# Altium footprint library UZ_CarrierBoard.PcbLib: 91 footprints (part 1 of 6)
Each footprint in its own frame and in the unit in brackets; x right, y up, seen from the top. Pads: shape width x height; smd on the part's side, far side on the other; paste and mask are expansions set on the pad; w line width, h text height; cw(c..) or ccw(c..) is an arc to the next point about the centre after c.
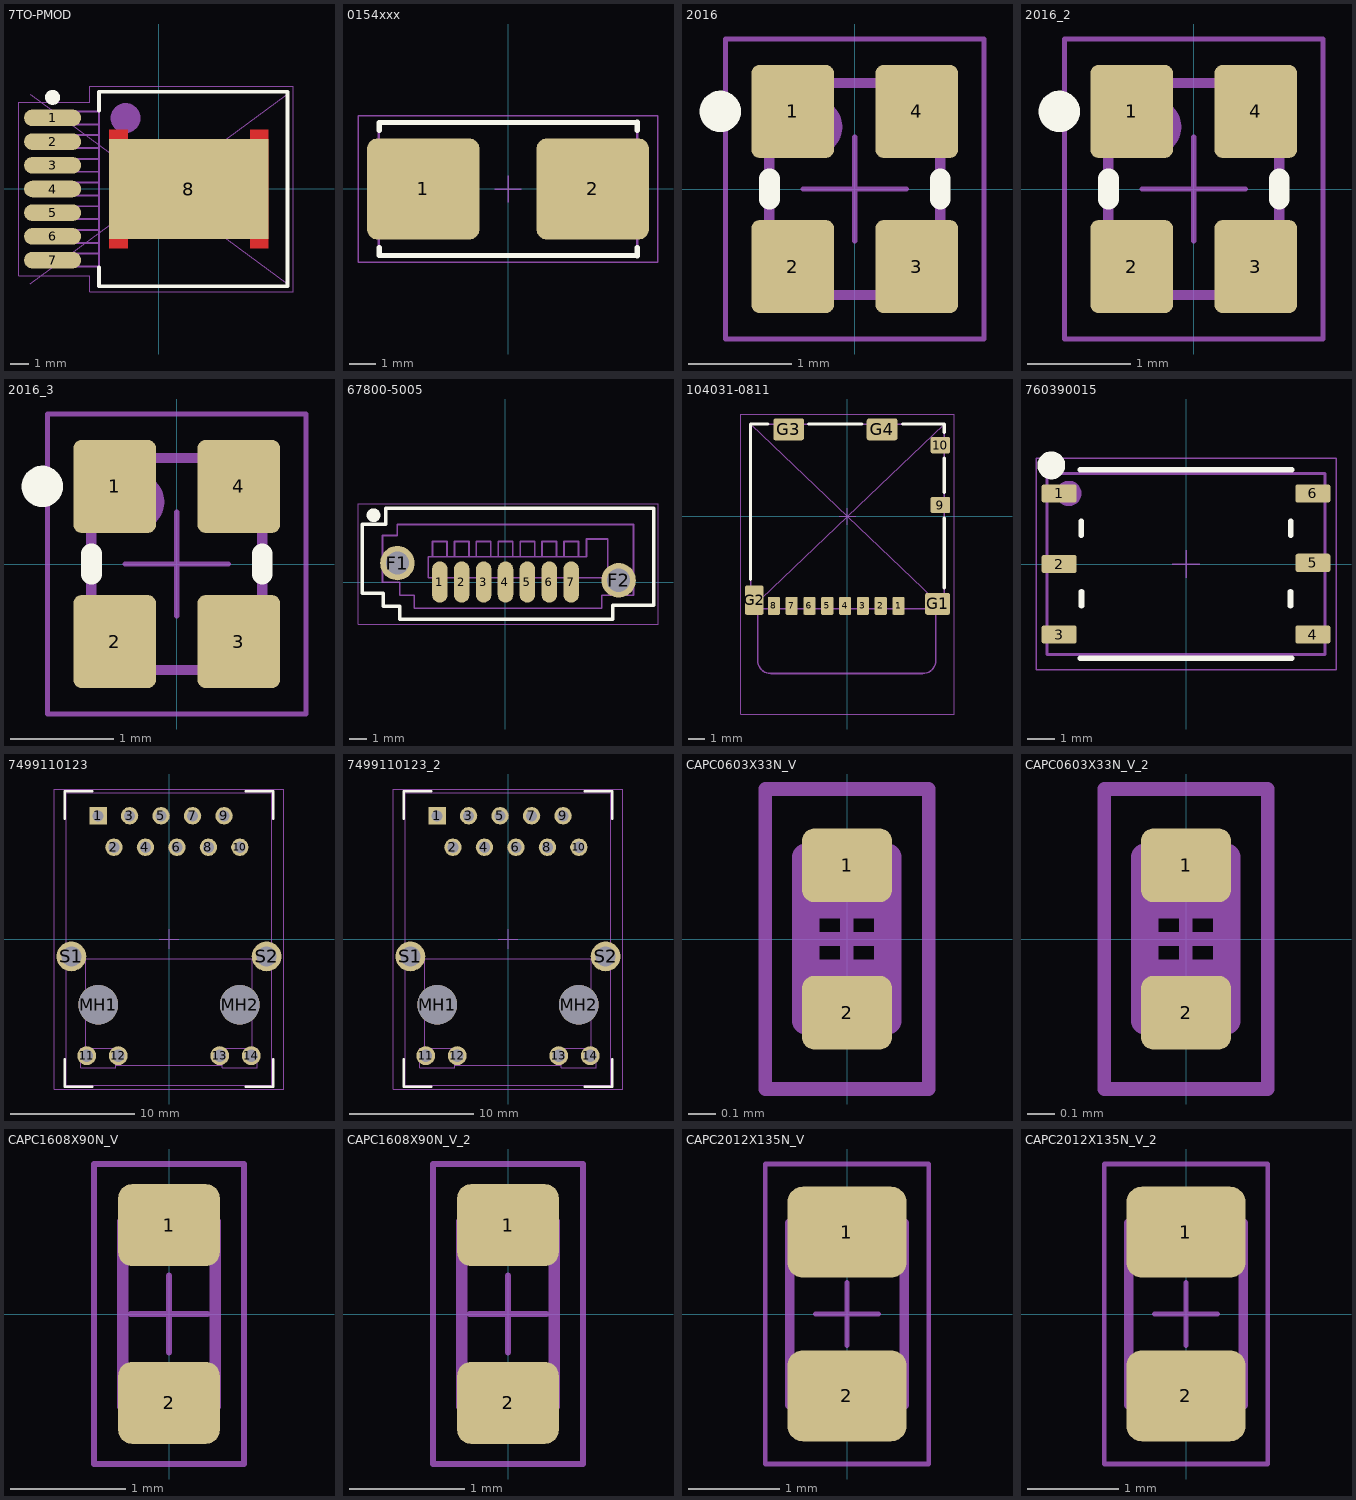
[diagram p0: the footprints below, top view; thin cyan lines are the x and y axes]

## 7TO-PMOD [mm]
pads (8):
  oval 3.06x0.89 smd: 1(-5.7,3.81) 2(-5.7,2.54) 3(-5.7,1.27) 4(-5.7,0) 5(-5.7,-1.27) 6(-5.7,-2.54) 7(-5.7,-3.81)
  rect 8.54x5.35 smd: 8(1.605,0)
Top Layer:
  region: -2.665,3.2 -2.665,-3.2 -1.665,-3.2 -1.665,3.2
  region: 5.875,-3.2 5.875,3.2 4.875,3.2 4.875,-3.2
Top Overlay:
  circle w0.4: c-5.7,4.91 r0.2
  lines w0.2: -3.215,-4.205 -3.215,-5.205 6.885,-5.205 6.885,5.205 -3.215,5.205 -3.215,4.205
Mechanical 13:
  circle w0.8: c-1.79,3.8 r0.4
  lines w0.1: -6.89,-4.155 -3.215,-4.155 ; -6.89,-3.465 -3.215,-3.465 ; -6.89,-2.885 -3.215,-2.885 ; -6.89,-2.195 -3.215,-2.195 ; -6.89,-1.615 -3.215,-1.615 ; -6.89,-0.925 -3.215,-0.925 ; -6.89,-0.345 -3.215,-0.345 ; -6.89,0.345 -3.215,0.345 ; -6.89,0.925 -3.215,0.925 ; -6.89,1.615 -3.215,1.615 ; -6.89,2.195 -3.215,2.195 ; -6.89,2.885 -3.215,2.885 ; -6.89,3.465 -3.215,3.465 ; -6.89,4.155 -3.215,4.155 ; -6.885,-4.155 -6.885,-3.465 ; -6.885,-2.885 -6.885,-2.195 ; -6.885,-1.615 -6.885,-0.925 ; -6.885,-0.345 -6.885,0.345 ; -6.885,0.925 -6.885,1.615 ; -6.885,2.195 -6.885,2.885 ; -6.885,3.465 -6.885,4.155 ; -4.79,-4.155 -4.79,-3.465 ; -4.79,-2.885 -4.79,-2.195 ; -4.79,-1.615 -4.79,-0.925 ; -4.79,-0.345 -4.79,0.345 ; -4.79,0.93 -4.79,1.615 ; -4.79,2.205 -4.79,2.885 ; -4.79,3.465 -4.79,4.155 ; -3.215,-5.205 6.885,-5.205 6.885,5.205 -3.215,5.205 -3.215,-5.205
  text ".Designator" at 1.512,1.045 h1
Mechanical 15:
  lines w0.05: -6.885,-5.08 6.885,5.08 ; -6.885,5.08 6.885,-5.08 ; -0.5,0 0.5,0 ; 0,-0.5 0,0.5 ; -7.5,-4.65 -3.7,-4.65 -3.7,-5.5 7.2,-5.5 7.2,5.5 -3.7,5.5 -3.7,4.65 -7.5,4.65 -7.5,-4.65
3D body: height 5.22, standoff 0, extent -1.739,2.675 -0.541,3.87
3D body "NDW0007A.stp": height 4.77, standoff 0, extent -6.885,-5.08 6.885,5.08

## 0154xxx [mm]
pads (2):
  rrect20% 4.24x3.81 smd: 1(-3.19,0) 2(3.19,0)
Top Overlay:
  lines w0.2: -4.85,-2.2 -4.85,-2.5 -4.835,-2.5 4.865,-2.515 4.865,-2.215 ; -4.85,2.2 -4.85,2.5 -4.835,2.5 4.865,2.515 4.865,2.215
Mechanical 13:
  lines w0.1: -4.865,-2.515 -4.865,2.515 4.865,2.515 4.865,-2.515 -4.865,-2.515
  text ".Designator" at -0.781,-0.456 h1
Mechanical 15:
  lines w0.05: -0.5,0 0.5,0 ; 0,-0.5 0,0.5 ; -5.65,-2.75 -5.65,2.75 5.65,2.75 5.65,-2.75 -5.65,-2.75
3D body "User Library-Littlefuse 0154 Holder and Fuse.STEP": height 3.71, standoff 0.01, extent -4.835,-2.485 4.865,2.515

## 2016 [mm]
pads (4):
  rrect20% 0.8x0.9 smd: 1(-0.6,0.75) 2(-0.6,-0.75) 3(0.6,-0.75) 4(0.6,0.75)
Top Overlay:
  circle w0.2: c-1.3,0.75 r0.1
  lines w0.2: -0.825,-0.1 -0.825,0.1 ; 0.825,-0.1 0.825,0.1
Mechanical 13:
  circle w0.28: c-0.4,0.6 r0.14
  lines w0.1: -0.825,-1.025 0.825,-1.025 0.825,1.025 ; -0.825,-1.025 -0.825,-1.025 ; -0.825,-1.025 -0.825,1.025 0.825,1.025 ; 0.825,1.025 0.825,1.025
  text ".Designator" at 1.834,2.284 h1
Mechanical 15:
  lines w0.05: -0.5,0 0.5,0 ; 0,-0.5 0,0.5 ; -1.25,-1.45 -1.25,1.45 1.25,1.45 1.25,-1.45 -1.25,-1.45
3D body: height 0.8, standoff 0, extent -0.825,-1.025 0.825,1.025
3D body: height 0.81, standoff 0, extent -0.599,0.4 -0.2,0.798

## 2016_2 [mm]
pads (4):
  rrect20% 0.8x0.9 smd: 1(-0.6,0.75) 2(-0.6,-0.75) 3(0.6,-0.75) 4(0.6,0.75)
Top Overlay:
  circle w0.2: c-1.3,0.75 r0.1
  lines w0.2: -0.825,-0.1 -0.825,0.1 ; 0.825,-0.1 0.825,0.1
Mechanical 13:
  circle w0.28: c-0.4,0.6 r0.14
  lines w0.1: -0.825,-1.025 0.825,-1.025 0.825,1.025 ; -0.825,-1.025 -0.825,-1.025 ; -0.825,-1.025 -0.825,1.025 0.825,1.025 ; 0.825,1.025 0.825,1.025
  text ".Designator" at 0.618,0.186 h1
Mechanical 15:
  lines w0.05: -0.5,0 0.5,0 ; 0,-0.5 0,0.5 ; -1.25,-1.45 -1.25,1.45 1.25,1.45 1.25,-1.45 -1.25,-1.45
3D body: height 0.8, standoff 0, extent -0.825,-1.025 0.825,1.025
3D body: height 0.81, standoff 0, extent -0.599,0.4 -0.2,0.798

## 2016_3 [mm]
pads (4):
  rrect20% 0.8x0.9 smd: 1(-0.6,0.75) 2(-0.6,-0.75) 3(0.6,-0.75) 4(0.6,0.75)
Top Overlay:
  circle w0.2: c-1.3,0.75 r0.1
  lines w0.2: -0.825,-0.1 -0.825,0.1 ; 0.825,-0.1 0.825,0.1
Mechanical 13:
  circle w0.28: c-0.4,0.6 r0.14
  lines w0.1: -0.825,-1.025 0.825,-1.025 0.825,1.025 ; -0.825,-1.025 -0.825,-1.025 ; -0.825,-1.025 -0.825,1.025 0.825,1.025 ; 0.825,1.025 0.825,1.025
  text ".Designator" at 2.101,-0.6 h1
Mechanical 15:
  lines w0.05: -0.5,0 0.5,0 ; 0,-0.5 0,0.5 ; -1.25,-1.45 -1.25,1.45 1.25,1.45 1.25,-1.45 -1.25,-1.45
3D body: height 0.8, standoff 0, extent -0.825,-1.025 0.825,1.025
3D body: height 0.81, standoff 0, extent -0.599,0.4 -0.2,0.798

## 67800-5005 [mm]
pads (9):
  oval 0.9x2.4 smd: 1(-3.81,0) 2(-2.54,0) 3(-1.27,0) 4(0,0) 5(1.27,0) 6(2.54,0) 7(3.81,0)
  round 2 hole 1.35: F1(-6.27,1.1) F2(6.56,0.1)
Top Overlay:
  circle w0.4: c-7.655,3.875 r0.2
  lines w0.2: -7.095,-1.41 -6.135,-1.41 -6.135,-2.16 6.215,-2.16 6.215,-1.36 8.595,-1.36 8.595,4.29 -6.935,4.29 -6.935,3.34 -8.305,3.34 -8.305,-0.66 -7.09,-0.66 -7.09,-1.41
Mechanical 13:
  circle w0.1: c-6.27,1.1 r0.5
  circle w0.1: c6.56,0.1 r0.5
  lines w0.1: -7.135,-0.02 -7.135,2.7 ; -7.13,-0.02 -6.13,-0.02 -6.13,-0.77 ; -7.13,2.7 -6.275,2.7 -6.275,3.34 7.425,3.34 7.425,-0.77 5.575,-0.77 5.575,-1.52 -5.285,-1.52 -5.285,-0.77 -6.135,-0.77 ; -7.095,-1.41 -6.135,-1.41 -6.135,-2.16 6.215,-2.16 6.215,-1.36 8.595,-1.36 8.595,4.29 -6.935,4.29 -6.935,3.34 -8.305,3.34 -8.305,-0.66 -7.09,-0.66 -7.09,-1.41 ; -4.23,1.47 -4.23,2.35 -3.39,2.35 -3.39,1.47 ; -2.96,1.47 -2.96,2.35 -2.12,2.35 -2.12,1.47 ; -1.69,1.47 -1.69,2.35 -0.85,2.35 -0.85,1.47 ; -0.42,1.47 -0.42,2.35 0.42,2.35 0.42,1.47 ; 0.85,1.47 0.85,2.35 1.69,2.35 1.69,1.47 ; 2.12,1.47 2.12,2.35 2.96,2.35 2.96,1.47 ; 3.39,1.47 3.39,2.35 4.23,2.35 4.23,1.47 ; -4.485,0.24 5.925,0.24 5.925,2.49 4.695,2.49 4.695,1.47 -4.485,1.47 -4.485,0.24
  text ".Designator" at -0.5,-1.1 h1
  text "1" at -3.885,2.51 h0.6
  text "2" at -2.73,2.51 h0.6
  text "3" at -1.47,2.51 h0.6
  text "4" at -0.21,2.51 h0.6
  text "5" at 1.05,2.51 h0.6
  text "6" at 2.31,2.51 h0.6
  text "7" at 3.675,2.51 h0.6
Mechanical 15:
  lines w0.05: -0.5,0 0.5,0 ; 0,-0.5 0,0.5 ; -8.555,-2.45 8.845,-2.45 8.845,4.54 -8.555,4.54 -8.555,-2.45
3D body "678005005.stp": height 8.6, standoff -2.45, extent -8.305,-2.16 8.595,4.29

## 104031-0811 [mm]
pads (14):
  rrect20% 0.75x1.1 smd: 1(3.155,-5.525) 2(2.055,-5.525) 3(0.955,-5.525) 4(-0.145,-5.525) 5(-1.245,-5.525) 6(-2.345,-5.525) 7(-3.445,-5.525) 8(-4.545,-5.525)
  rrect20% 1.2x1 smd: 9(5.74,0.7) 10(5.74,4.4)
  rrect20% 1.55x1.35 smd: G1(5.565,-5.4)
  rrect20% 1.17x1.8 smd: G2(-5.755,-5.175)
  rrect20% 1.9x1.35 smd: G3(-3.63,5.375) G4(2.14,5.375)
Top Overlay:
  lines w0.2: -5.98,-3.9 -5.98,5.7 -4.9,5.7 ; -2.4,5.7 0.9,5.7 ; 3.4,5.705 5.975,5.705 5.975,5.2 ; 5.975,-4.4 5.975,-0.1 ; 5.975,1.5 5.975,3.6
Mechanical 13:
  lines w0.1: -5.545,-5.7 -5.545,-8.9 ccw(c-4.745,-8.9) -4.745,-9.7 4.655,-9.7 ; 0,-5.7 5.565,-5.7 ; 5.455,-5.7 5.455,-8.9 ; 4.655,-9.7 ccw(c4.655,-8.9) 5.455,-8.9 ; 4.655,-9.7 ccw(c4.655,-8.9) 5.455,-8.9 ; -5.975,-5.7 -5.975,5.7 5.975,5.7 5.975,-5.7 -5.975,-5.7
  text ".Designator" at 0.554,-1.554 h1.3
Mechanical 15:
  lines w0.05: -5.975,-5.7 5.975,5.7 ; -5.975,5.7 5.975,-5.7 ; -0.5,0 0.5,0 ; -0.1,-5.7 0.1,-5.7 ; 0,-5.8 0,-5.6 ; 0,-0.5 0,0.5 ; -6.6,-12.2 -6.6,6.3 6.6,6.3 6.6,-12.2 -6.6,-12.2
3D body "1040310811.stp": height 1.43, standoff -0.02, extent -5.975,-5.7 5.975,5.7
3D body "SW3dPS-Micro_SD.STEP": height 1.45, standoff 0.47, extent -5.5,-9.7 5.5,5.3

## 760390015 [mm]
pads (6):
  rrect30% 1.27x0.66 smd: 1(-4.57,2.54) 2(-4.57,0) 3(-4.57,-2.54) 4(4.57,-2.54) 5(4.57,0.04) 6(4.57,2.54)
Top Overlay:
  circle w0.5: c-4.85,3.55 r0.25
  lines w0.2: -3.8,-3.4 3.8,-3.4 ; -3.8,3.4 3.8,3.4 ; -3.77,1.04 -3.77,1.54 ; -3.762,-1.5 -3.762,-1 ; 3.762,-1.5 3.762,-1 ; 3.77,1.04 3.77,1.54
Mechanical 13:
  circle w0.457: c-4.22,2.54 r0.229
  lines w0.1: -5,-3.26 5,-3.26 5,3.26 -5,3.26 -5,-3.26
  text ".Designator" at 0.926,-1.402 h1
Mechanical 15:
  lines w0.05: -0.5,0 0.5,0 ; 0,-0.5 0,0.5 ; -5.4,-3.8 -5.4,3.8 5.4,3.8 5.4,-3.8 -5.4,-3.8
3D body "250-1109 (rev1).STEP": height 4.06, standoff 0, extent -4.98,-3.23 4.98,3.25

## 7499110123 [mm]
pads (18):
  rect 1.4x1.4 hole 0.89: 1(-5.715,9.94)
  round 1.4 hole 0.89: 2(-4.445,7.4) 3(-3.175,9.94) 4(-1.905,7.4) 5(-0.635,9.94) 6(0.635,7.4) 7(1.905,9.94) 8(3.175,7.4) 9(4.445,9.94) 10(5.715,7.4)
  round 1.52 hole 1.02: 11(-6.635,-9.41) 12(-4.095,-9.41) 13(4.095,-9.41) 14(6.635,-9.41)
  round 3.2 hole 3.2 unplated: MH1(-5.715,-5.3) MH2(5.715,-5.3)
  round 2.4 hole 1.63: S1(-7.875,-1.41) S2(7.875,-1.41)
Top Overlay:
  lines w0.2: -8.4,-9.7 -8.4,-11.9 -6.2,-11.9 ; -8.4,9.7 -8.4,11.9 -6.2,11.9 ; 6.2,-11.9 8.4,-11.9 8.4,-9.7 ; 6.2,11.9 8.4,11.9 8.4,9.7
Mechanical 13:
  lines w0.1: -6.7,-8.8 -6.7,-1.6 6.7,-1.6 6.7,-8.8 ; -4.3,-10.2 4.3,-10.2 ; -8.3,-11.8 8.3,-11.8 8.3,11.8 -8.3,11.8 -8.3,-11.8 ; -7.1,-10.4 -4.3,-10.4 -4.3,-8.8 -7.1,-8.8 -7.1,-10.4 ; 4.3,-10.4 7.1,-10.4 7.1,-8.8 4.3,-8.8 4.3,-10.4
  text ".Designator" at 0.294,-7 h1
Mechanical 15:
  lines w0.1: -0.8,0 0.8,0 ; 0,-0.8 0,0.8 ; -9.275,-12.1 -9.275,12.1 9.275,12.1 9.275,-12.1 -9.275,-12.1
3D body "7499110123.stp": height 17.2, standoff -2.7, extent -8.3,-11.8 8.3,11.8

## 7499110123_2 [mm]
pads (18):
  rect 1.4x1.4 hole 0.89: 1(-5.715,9.94)
  round 1.4 hole 0.89: 2(-4.445,7.4) 3(-3.175,9.94) 4(-1.905,7.4) 5(-0.635,9.94) 6(0.635,7.4) 7(1.905,9.94) 8(3.175,7.4) 9(4.445,9.94) 10(5.715,7.4)
  round 1.52 hole 1.02: 11(-6.635,-9.41) 12(-4.095,-9.41) 13(4.095,-9.41) 14(6.635,-9.41)
  round 3.2 hole 3.2 unplated: MH1(-5.715,-5.3) MH2(5.715,-5.3)
  round 2.4 hole 1.63: S1(-7.875,-1.41) S2(7.875,-1.41)
Top Overlay:
  lines w0.2: -8.4,-9.7 -8.4,-11.9 -6.2,-11.9 ; -8.4,9.7 -8.4,11.9 -6.2,11.9 ; 6.2,-11.9 8.4,-11.9 8.4,-9.7 ; 6.2,11.9 8.4,11.9 8.4,9.7
Mechanical 13:
  lines w0.1: -6.7,-8.8 -6.7,-1.6 6.7,-1.6 6.7,-8.8 ; -4.3,-10.2 4.3,-10.2 ; -8.3,-11.8 8.3,-11.8 8.3,11.8 -8.3,11.8 -8.3,-11.8 ; -7.1,-10.4 -4.3,-10.4 -4.3,-8.8 -7.1,-8.8 -7.1,-10.4 ; 4.3,-10.4 7.1,-10.4 7.1,-8.8 4.3,-8.8 4.3,-10.4
  text ".Designator" at -1.3,-0.8 h1.3
Mechanical 15:
  lines w0.1: -0.8,0 0.8,0 ; 0,-0.8 0,0.8 ; -9.275,-12.1 -9.275,12.1 9.275,12.1 9.275,-12.1 -9.275,-12.1
3D body "7499110123.stp": height 17.2, standoff -2.7, extent -8.3,-11.8 8.3,11.8

## CAPC0603X33N_V [mm]
pads (2):
  rrect33% 0.33x0.27 smd: 1(0,0.27) 2(0,-0.27)
Mechanical 13:
  lines w0.1: -0.151,-0.125 0.149,-0.125 ; -0.151,0.125 0.149,0.125 ; -0.151,-0.3 0.149,-0.3 0.149,0.3 -0.151,0.3 -0.151,-0.3
  text ".Designator" at 0.3,0.45 h0.7
Mechanical 15:
  lines w0.05: -0.161,0 0.159,0 ; -0.001,-0.16 -0.001,0.16 ; -0.3,-0.55 0.3,-0.55 0.3,0.55 -0.3,0.55 -0.3,-0.55
3D body "User Library-SMD 0201 CAPACITOR.STEP": height 0.29, standoff -0.01, extent -0.15,-0.3 0.15,0.3

## CAPC0603X33N_V_2 [mm]
pads (2):
  rrect33% 0.33x0.27 smd: 1(0,0.27) 2(0,-0.27)
Mechanical 13:
  lines w0.1: -0.151,-0.125 0.149,-0.125 ; -0.151,0.125 0.149,0.125 ; -0.151,-0.3 0.149,-0.3 0.149,0.3 -0.151,0.3 -0.151,-0.3
  text ".Designator" at 0.133,-3.13 h0.7
Mechanical 15:
  lines w0.05: -0.161,0 0.159,0 ; -0.001,-0.16 -0.001,0.16 ; -0.3,-0.55 0.3,-0.55 0.3,0.55 -0.3,0.55 -0.3,-0.55
3D body "User Library-SMD 0201 CAPACITOR.STEP": height 0.29, standoff -0.01, extent -0.15,-0.3 0.15,0.3

## CAPC1608X90N_V [mm]
pads (2):
  rrect33% 0.88x0.71 smd: 1(0,0.77) 2(0,-0.77)
Mechanical 13:
  lines w0.1: -0.4,-0.5 0.4,-0.5 ; -0.4,0.5 0.4,0.5 ; -0.4,-0.8 0.4,-0.8 0.4,0.8 -0.4,0.8 -0.4,-0.8
  text ".Designator" at -0.45,4.25 h0.7
Mechanical 15:
  lines w0.05: -0.332,0 0.333,0 ; 0,-0.333 0,0.333 ; -0.65,-1.3 0.65,-1.3 0.65,1.3 -0.65,1.3 -0.65,-1.3
3D body "User Library-SMD CAPACITOR0603.STEP": height 0.8, standoff 0, extent -0.4,-0.8 0.4,0.8

## CAPC1608X90N_V_2 [mm]
pads (2):
  rrect33% 0.88x0.71 smd: 1(0,0.77) 2(0,-0.77)
Mechanical 13:
  lines w0.1: -0.4,-0.5 0.4,-0.5 ; -0.4,0.5 0.4,0.5 ; -0.4,-0.8 0.4,-0.8 0.4,0.8 -0.4,0.8 -0.4,-0.8
  text ".Designator" at 0.533,1.354 h0.7
Mechanical 15:
  lines w0.05: -0.332,0 0.333,0 ; 0,-0.333 0,0.333 ; -0.65,-1.3 0.65,-1.3 0.65,1.3 -0.65,1.3 -0.65,-1.3
3D body "User Library-SMD CAPACITOR0603.STEP": height 0.8, standoff 0, extent -0.4,-0.8 0.4,0.8

## CAPC2012X135N_V [mm]
pads (2):
  rrect33% 1.31x1 smd: 1(0,0.9) 2(0,-0.9)
Mechanical 13:
  lines w0.1: -0.625,-0.6 0.63,-0.6 ; -0.625,0.6 0.625,0.6 ; -0.63,-1 -0.63,1 0.63,1 0.63,-1 -0.63,-1
  text ".Designator" at 1,1.2 h0.7
Mechanical 15:
  lines w0.05: -0.35,0 0.35,0 ; 0,-0.35 0,0.35 ; -0.9,-1.65 -0.9,1.65 0.9,1.65 0.9,-1.65 -0.9,-1.65
3D body "User Library-SMD CAPACITOR0805.STEP": height 1.1, standoff 0.5, extent -0.625,-1 0.625,1
3D body "User Library-SMD CAPACITOR0805.STEP": height 0.6, standoff 0, extent -0.625,-1 0.625,1

## CAPC2012X135N_V_2 [mm]
pads (2):
  rrect33% 1.31x1 smd: 1(0,0.9) 2(0,-0.9)
Mechanical 13:
  lines w0.1: -0.625,-0.6 0.63,-0.6 ; -0.625,0.6 0.625,0.6 ; -0.63,-1 -0.63,1 0.63,1 0.63,-1 -0.63,-1
  text ".Designator" at -1.016,-1.859 h0.7
Mechanical 15:
  lines w0.05: -0.35,0 0.35,0 ; 0,-0.35 0,0.35 ; -0.9,-1.65 -0.9,1.65 0.9,1.65 0.9,-1.65 -0.9,-1.65
3D body "User Library-SMD CAPACITOR0805.STEP": height 1.1, standoff 0.5, extent -0.625,-1 0.625,1
3D body "User Library-SMD CAPACITOR0805.STEP": height 0.6, standoff 0, extent -0.625,-1 0.625,1